# Altium schematic symbol library BARKO_SCHLIB.SchLib: 1064 symbols (part 1 of 11) (continued)
## C-2U2F-0603_1 (continued)
CAP CER 2.2UF 10V X7R 0603; Manufacturer: Samsung; Manufacturer Part Number: CL10B225KP8NNNC; Material: Ceramic; Tolerance: 10%; .PCBCHK: USED; .Creator: F:TALI; Washability: OK; Stock 1: 0; Pricing 1: 1=0.19, 10=0.133, 100=0.0625, 500=0.04384, 1000=0.0363 (USD); Mount: Surface Mount; Case Code (Metric): 1608; Contact Plating: Tin; Min Operating Temperature: -55°C; Max Operating Temperature: 125°C; Package Quantity: 1; Packaging: Tape and Reel; Capacitance: 2.2uF; Dielectric: X7R; Length: 1.6mm; Height: 0.8mm; Width: 0.031inch; Thickness: 0.035inch; Depth: 0.8mm; Radiation Hardening: No; ComponentLink1URL: https://media.digikey.com/pdf/Data%20Sheets/Samsung%20PDFs/CL_Series_MLCC_ds.pdf; ComponentLink1Description: https://media.digikey.com/pdf/Data%20Sheets/Samsung%20PDFs/CL_Series_MLCC_ds.pdf; ComponentLink2URL: http://www1.futureelectronics.com/doc/SAMSUNG/CL10B225KP8NNNC.pdf; ComponentLink2Description: http://www1.futureelectronics.com/doc/SAMSUNG/CL10B225KP8NNNC.pdf; ComponentLink3URL: https://www.verical.com/server-webapp/html/getDatasheet?partID=359568; ComponentLink3Description: https://www.verical.com/server-webapp/html/getDatasheet?partID=359568; ComponentLink4URL: https://produktinfo.conrad.com/datenblaetter/450000-474999/457933-da-01-en-VS_KONDENSATOR_0603.pdf; ComponentLink4Description: https://produktinfo.conrad.com/datenblaetter/450000-474999/457933-da-01-en-VS_KONDENSATOR_0603.pdf; Case Code (Imperial): 0603; Stock 2: 0; Pricing 2: 1=0.28, 10=0.194, 100=0.0981, 500=0.06714, 1000=0.0594 (USD); Weight: 7.1E-05oz; Dielectric Material: Ceramic; Voltage Rating (DC): 10V; Termination: SMD/SMT; Composition: Ceramic; Lead Free: Lead Free; REACH SVHC: No SVHC; ComponentLink5URL: https://product.tdk.com/info/en/catalog/spec/mlccspec_commercial_general_midvoltage_en.pdf; ComponentLink5Description: https://product.tdk.com/info/en/catalog/spec/mlccspec_commercial_general_midvoltage_en.pdf; ComponentLink6URL: http://www.mouser.com/ds/2/400/lcc_commercial_general_en-837201.pdf; ComponentLink6Description: http://www.mouser.com/ds/2/400/lcc_commercial_general_en-837201.pdf; ComponentLink7URL: http://www.farnell.com/datasheets/2291921.pdf; ComponentLink7Description: http://www.farnell.com/datasheets/2291921.pdf; ComponentLink8URL: http://www.farnell.com/datasheets/1796654.pdf; ComponentLink8Description: http://www.farnell.com/datasheets/1796654.pdf; ComponentLink9URL: http://www.farnell.com/datasheets/1913358.pdf; ComponentLink9Description: http://www.farnell.com/datasheets/1913358.pdf; Stock 3: 0; Pricing 3: 1=0.33, 10=0.228, 100=0.1291, 500=0.0911, 1000=0.07971 (USD); Features: Soft Termination; .SCHCHK: USED; Supplier 1: Digi-Key; Supplier Part Number 1: 1276-1134-6-ND
footprint C-0603
pins: 1, 2

## C-2U2F-0603_2
designator C?, comment 2U2F  Case/Package: 0603  Voltage Rating: 6.3V
CAP CER 2.2UF 6.3V X7R 0603; Manufacturer: Samsung; Manufacturer Part Number: CL10B225KQ8NFNC; Tolerance: 10%; Dielectric Material: Ceramic; .PCBCHK: USED; .Creator: F:TALI; Washability: OK; Stock 1: 0; Pricing 1: 1=0.14, 10=0.099, 100=0.0467, 500=0.03272, 1000=0.02708 (USD); Mount: Surface Mount; Case Code (Metric): 1608; Case Code (Imperial): 0603; Min Operating Temperature: -55°C; Max Operating Temperature: 125°C; Package Quantity: 1; Packaging: Tape and Reel; Capacitance: 2.2uF; Dielectric: X7R; Length: 0.063inch; Height: 0.8mm; Width: 0.031inch; Thickness: 0.035inch; Depth: 0.8mm; Radiation Hardening: No; ComponentLink1URL: http://www.samsungsem.com/kr/front/downloadcms.do?path=/kr/support/product-search/mlcc/__icsFiles/afieldfile/2014/11/05&fileName=C_CL10B225KQ8NFNC.pdf; ComponentLink1Description: http://www.samsungsem.com/kr/front/downloadcms.do?path=/kr/support/product-search/mlcc/__icsFiles/afieldfile/2014/11/05&fileName=C_CL10B225KQ8NFNC.pdf; Stock 2: 1; Pricing 2: 1=0.29, 10=0.198, 100=0.1124, 500=0.07936, 1000=0.06943 (USD); Weight: 7.1E-05oz; Voltage Rating (DC): 6.3V; Termination: SMD/SMT; Composition: Ceramic; Lead Free: Lead Free; REACH SVHC: No SVHC; ComponentLink2URL: http://www.mouser.com/ds/2/400/lcc_commercial_general_en-837201.pdf; ComponentLink2Description: http://www.mouser.com/ds/2/400/lcc_commercial_general_en-837201.pdf; ComponentLink3URL: https://product.tdk.com/info/en/catalog/spec/mlccspec_commercial_general_midvoltage_en.pdf; ComponentLink3Description: https://product.tdk.com/info/en/catalog/spec/mlccspec_commercial_general_midvoltage_en.pdf; ComponentLink4URL: http://www.farnell.com/datasheets/1796654.pdf; ComponentLink4Description: http://www.farnell.com/datasheets/1796654.pdf; ComponentLink5URL: https://product.tdk.com/en/products/common/pdf/mlcc_partnumber_description.pdf; ComponentLink5Description: https://product.tdk.com/en/products/common/pdf/mlcc_partnumber_description.pdf; Stock 3: 48; Pricing 3: 1=0.29, 10=0.197, 100=0.1, 500=0.06842, 1000=0.06052 (USD); .SCHCHK: USED; Supplier 1: Digi-Key; Supplier Part Number 1: 1276-2017-6-ND
footprint C-0603
pins: 1, 2

## C-2U2F-1206
designator C?, comment 2U2F  Voltage Rating: 35V  Case/Package: 1206
CAP TANT 2.2UF 35V 20% 1206; Manufacturer: KEMET; Manufacturer Part Number: T491A225M035AT; ESR (Equivalent Series Resistance): 4.5R; Life (Hours): 2000Hour; Polarity: Polar; Dissipation Factor: 6%; Dielectric Material: Tantalum; Leakage Current: 500nA; .PCBCHK: USED; .Creator: F:TALI; Washability: OK; Stock 1: 229187; Pricing 1: 1=0.65, 10=0.463, 100=0.3048, 500=0.22582, 1000=0.19194 (USD); Mount: Surface Mount; Case Code (Metric): 3216; Case Code (Imperial): 1206; Min Operating Temperature: -55°C; Max Operating Temperature: 125°C; Package Quantity: 2000; Packaging: Tape and Reel; Capacitance: 2.2uF; Tolerance: 20%; Voltage Rating (DC): 35V; Features: General Purpose; Length: 0.126inch; Height: 1.6mm; Width: 0.063inch; Height - Seated (Max): 0.071inch; Depth: 1.6mm; Radiation Hardening: No; Lead Free: Lead Free; ComponentLink1URL: http://www.kemet.com/Lists/ProductCatalog/Attachments/254/KEM_T2005_T491.pdf; ComponentLink1Description: http://www.kemet.com/Lists/ProductCatalog/Attachments/254/KEM_T2005_T491.pdf; Stock 2: 743; Pricing 2: 1=0.65, 10=0.463, 100=0.3048, 500=0.22582, 1000=0.19194 (USD); REACH SVHC: No SVHC; Stock 3: 30366; Pricing 3: 1=0.93, 10=0.706, 100=0.5053, 500=0.39124, 1000=0.33689 (USD); Number of Pins: 2; Weight: 0.000571oz; Termination: SMD/SMT; ComponentLink2URL: http://datasheets.avx.com/TAJ.pdf; ComponentLink2Description: http://datasheets.avx.com/TAJ.pdf; ComponentLink3URL: https://www.verical.com/server-webapp/html/getDatasheet?partID=62912; ComponentLink3Description: https://www.verical.com/server-webapp/html/getDatasheet?partID=62912; ComponentLink4URL: http://www.avx.com/docs/Catalogs/taj.pdf; ComponentLink4Description: http://www.avx.com/docs/Catalogs/taj.pdf; ComponentLink5URL: http://www.farnell.com/datasheets/1680476.pdf; ComponentLink5Description: http://www.farnell.com/datasheets/1680476.pdf; .SCHCHK: USED; Supplier 1: Digi-Key; Supplier Part Number 1: 399-10446-6-ND
footprint C-1206
pins: 1, 2
text: +

## C-2U2F-1210
designator C?, comment 2U2F  Voltage: 100V  Case/Package: 1210
CAP CER 2.2UF 100V X7R 1210; Manufacturer: Samsung; Manufacturer Part Number: CL32B225KCJSNNE; Tolerance: 10%; .PCBCHK: USED; .Creator: F:TALI; Washability: OK; Stock 1: 0; Pricing 1: 1=0.58, 10=0.41, 100=0.27, 500=0.2 (USD); Mount: Surface Mount; Case Code (Metric): 3225; Case Code (Imperial): 1210; Contact Plating: Tin; Min Operating Temperature: -55°C; Max Operating Temperature: 125°C; Capacitance: 2.2uF; Voltage Rating: 100V; Packaging: Tape and Reel; Package Quantity: 1; Dielectric: X7R; Length: 3.2mm; Height: 2.5mm; Width: 0.098inch; Thickness: 0.106inch; Depth: 2.5mm; Radiation Hardening: No; ComponentLink1URL: http://www1.futureelectronics.com/doc/SAMSUNG/CL32B225KCJSNNE.pdf; ComponentLink1Description: http://www1.futureelectronics.com/doc/SAMSUNG/CL32B225KCJSNNE.pdf; ComponentLink2URL: http://www.samsungsem.com/kr/support/product-search/mlcc/CL32B225KCJSNNE .jsp; ComponentLink2Description: http://www.samsungsem.com/kr/support/product-search/mlcc/CL32B225KCJSNNE .jsp; ComponentLink3URL: https://www.verical.com/server-webapp/html/getDatasheet?partID=357497; ComponentLink3Description: https://www.verical.com/server-webapp/html/getDatasheet?partID=357497; Stock 2: 0; Pricing 2: 1=0.92, 10=0.648, 100=0.4269, 500=0.31626 (USD); Number of Pins: 2; Weight: 0.000564oz; Voltage Rating (DC): 100V; Termination: SMD/SMT; Composition: Ceramic; REACH SVHC: No SVHC; Lead Free: Lead Free; ComponentLink4URL: http://www.mouser.com/ds/2/400/lcc_commercial_general_en-837201.pdf; ComponentLink4Description: http://www.mouser.com/ds/2/400/lcc_commercial_general_en-837201.pdf; ComponentLink5URL: http://www.farnell.com/datasheets/1698875.pdf; ComponentLink5Description: http://www.farnell.com/datasheets/1698875.pdf; ComponentLink6URL: http://www.farnell.com/datasheets/1484596.pdf; ComponentLink6Description: http://www.farnell.com/datasheets/1484596.pdf; ComponentLink7URL: https://www.verical.com/server-webapp/html/getDatasheet?partID=725361; ComponentLink7Description: https://www.verical.com/server-webapp/html/getDatasheet?partID=725361; ComponentLink8URL: http://product.tdk.com/en/catalog/datasheets/mlcc_commercial_midvoltage_en.pdf; ComponentLink8Description: http://product.tdk.com/en/catalog/datasheets/mlcc_commercial_midvoltage_en.pdf; Stock 3: 0; Pricing 3: 1=1.42, 10=1.121, 100=0.8409 (USD); Features: Soft Termination; Ratings: AEC-Q200; .SCHCHK: USED; Supplier 1: Digi-Key; Supplier Part Number 1: 1276-3362-6-ND
footprint C-1210
pins: 1, 2

## C-2u2F-2220
designator C?, comment 2u2F  Case/Package: 2220  Voltage Rating: 250V
CAP CER 2.2UF 250V X7T 2220; Manufacturer: TDK; Manufacturer Part Number: C5750X7T2E225M250KA; Tolerance: 20%; Ripple Current: 900mA; Polarity: Polar; Impedance: 120mR; Voltage: 50V; Life (Hours): 2000Hour; Supplier 1: Digi-Key; Supplier Part Number 1: 445-13418-1-ND; Stock: 3362; Pricing: 1=3.37, 10=2.723, 50=2.376, 100=2.079 (USD); RoHS: Yes; Mount: Surface Mount; Weight: 0.016932oz; Case Code (Imperial): 2220; Case Code (Metric): 5750; Min Operating Temperature: -55°C; Max Operating Temperature: 125°C; Dielectric: X7T; Termination: SMD/SMT; Voltage Rating (DC): 250V; Package Quantity: 1; Packaging: Tape and Reel; Capacitance: 2.2uF; Length: 0.224inch; Height: 2.5mm; Thickness: 0.11inch; Width: 5mm; Lead Free: Lead Free; ComponentLink1URL: http://www.mouser.com/ds/2/400/lcc_commercial_general_en-837201.pdf?src-supplier=Mouser; ComponentLink1Description: http://www.mouser.com/ds/2/400/lcc_commercial_general_en-837201.pdf?src-supplier=Mouser; ComponentLink2URL: https://product.tdk.com/info/en/catalog/spec/mlccspec_commercial_general_midvoltage_en.pdf?src-supplier=Digi-Key; ComponentLink2Description: https://product.tdk.com/info/en/catalog/spec/mlccspec_commercial_general_midvoltage_en.pdf?src-supplier=Digi-Key; ComponentLink3URL: https://product.tdk.com/info/en/documents/chara_sheet/C5750X7T2E225M250KA.pdf?src-supplier=Digi-Key; ComponentLink3Description: https://product.tdk.com/info/en/documents/chara_sheet/C5750X7T2E225M250KA.pdf?src-supplier=Digi-Key; ComponentLink4URL: http://product.tdk.com/en/catalog/datasheets/mlcc_commercial_midvoltage_en.pdf?src-supplier=Avnet; ComponentLink4Description: http://product.tdk.com/en/catalog/datasheets/mlcc_commercial_midvoltage_en.pdf?src-supplier=Avnet; Diameter: 10mm; Height - Seated (Max): 0.413inch; Lead Pitch: 4.5mm; ComponentLink5URL: http://www.mouser.com/ds/2/293/e-ucm-883824.pdf?src-supplier=Mouser; ComponentLink5Description: http://www.mouser.com/ds/2/293/e-ucm-883824.pdf?src-supplier=Mouser; ComponentLink6URL: http://uk.rs-online.com/webdocs/13bc/0900766b813bca52.pdf?src-supplier=RSComponents; ComponentLink6Description: http://uk.rs-online.com/webdocs/13bc/0900766b813bca52.pdf?src-supplier=RSComponents; ComponentLink7URL: http://nichicon-us.com/english/products/pdfs/e-ch_ta.pdf?src-supplier=Digi-Key; ComponentLink7Description: http://nichicon-us.com/english/products/pdfs/e-ch_ta.pdf?src-supplier=Digi-Key; ComponentLink8URL: http://nichicon-us.com/english/products/pdfs/e-ucm.pdf?src-supplier=Digi-Key; ComponentLink8Description: http://nichicon-us.com/english/products/pdfs/e-ucm.pdf?src-supplier=Digi-Key
footprint C-2220
pins: 1, 2

## C-3N3F-0603
designator C?, comment 3N3F  Voltage Rating: 100V  Case/Package: 0603
CAP CER 3300PF 100V X7R 0603; Manufacturer: TDK; Manufacturer Part Number: CGA3E2X7R2A332K080AA; Capacitance: 3.3nF; Tolerance: 10%; .PCBCHK: USED; .Creator: F:TALI; Washability: OK; Stock 1: 22990; Pricing 1: 1=0.1, 10=0.076, 100=0.0338, 500=0.02416, 1000=0.01898 (USD); Mount: Surface Mount; Weight: 7.1E-05oz; Case Code (Metric): 1608; Case Code (Imperial): 0603; Min Operating Temperature: -55°C; Max Operating Temperature: 125°C; Package Quantity: 4000; Packaging: Tape and Reel; Voltage Rating (DC): 100V; Dielectric: X7R; Termination: SMD/SMT; Composition: Ceramic; Length: 1.6mm; Height: 0.8mm; Width: 0.031inch; Thickness: 0.035inch; Depth: 0.8mm; Ratings: AEC-Q200; REACH SVHC: No SVHC; ComponentLink1URL: http://www.mouser.com/ds/2/400/lcc_automotive_midvoltage_en-355485.pdf; ComponentLink1Description: http://www.mouser.com/ds/2/400/lcc_automotive_midvoltage_en-355485.pdf; ComponentLink2URL: http://www.farnell.com/datasheets/1807242.pdf; ComponentLink2Description: http://www.farnell.com/datasheets/1807242.pdf; Stock 2: 40000; Pricing 2: 1=0.16, 10=0.114, 100=0.0535, 500=0.03748, 1000=0.03103 (USD); Radiation Hardening: No; Lead Free: Lead Free; ComponentLink3URL: http://search.murata.co.jp/Ceramy/image/img/w_hinm/S0717E.pdf; ComponentLink3Description: http://search.murata.co.jp/Ceramy/image/img/w_hinm/S0717E.pdf; ComponentLink4URL: http://psearch.murata.com/capacitor/product/GCM188R72A332KA37%23.pdf; ComponentLink4Description: http://psearch.murata.com/capacitor/product/GCM188R72A332KA37%23.pdf; .SCHCHK: USED; Supplier 1: Digi-Key; Supplier Part Number 1: 445-5809-6-ND
footprint C-0603
pins: 1, 2

## C-3n3F-0805
designator C?, comment 3n3F  Voltage Rating: 50V  Case/Package: 0805
CAP CER 3300PF 50V X7R 0805; Manufacturer 1: Wurth Electronics; Manufacturer Part Number: 885012207089; Capacitance: 3.3nF; Tolerance: 10%; .Creator: M.OZKAN; .PCBCHK: USED; Supplier 1: Digi-Key; Supplier Part Number 1: 732-8071-1-ND; RoHS: Yes; Category: Ceramic Capacitors; Stock: 3791; Pricing: 1=0,10000, 10=0,03600, 100=0,03230, 500=0,02858 (USD); Mount: Surface Mount; Case Code (Imperial): 0805; Case Code (Metric): 2012; Min Operating Temperature: -55°C; Max Operating Temperature: 125°C; Packaging: Tape and Reel; Length: 0.079inch; Width: 0.049inch; Thickness: 0.035inch; ComponentLink1URL: https://katalog.we-online.de/pbs/datasheet/885012207089.pdf?src-supplier=Digi-Key; ComponentLink1Description: https://katalog.we-online.de/pbs/datasheet/885012207089.pdf?src-supplier=Digi-Key; .SCHCHK: USED
footprint C-0805
pins: 1, 2

## C-3P9F-0402
designator C?, comment 3P9F  Voltage Rating: 50V  Case/Package: 0402
CAP CER 3.9PF 50V C0G/NP0 0402; Manufacturer: Murata; Manufacturer Part Number: GJM1555C1H3R9WB01D; Dielectric: C0G; Washability: OK; .Creator: M.OZKAN; .PCBCHK: USED; Stock: 39877; Pricing: 1=0,30000, 10=0,20500, 100=0,11610, 500=0,08198, 1000=0,07173, 2500=0,06831, 5000=0,06319 (USD); RoHS: Yes; Mount: Surface Mount; Case Code (Imperial): 0402; Case Code (Metric): 1005; Min Operating Temperature: -55°C; Max Operating Temperature: 125°C; Voltage Rating (DC): 50V; Capacitance: 3.9pF; Packaging: Tape and Reel; Package Quantity: 10000; Termination: SMD/SMT; Length: 1mm; Height: 0.5mm; Width: 0.02inch; Thickness: 0.022inch; Depth: 0.5mm; Radiation Hardening: No; ComponentLink1URL: https://datasheet.ciiva.com/11613/product-11613637.pdf?src-supplier=Avnet; ComponentLink1Description: https://datasheet.ciiva.com/11613/product-11613637.pdf?src-supplier=Avnet; Supplier Part Number: 490-11216-1-ND; Supplier 1: Digi-Key; Supplier Part Number 1: 490-11216-1-ND; .SCHCHK: USED
footprint C-0402
pins: 1, 2

## C-3PF-0402
designator C?, comment 3PF  Voltage Rating: 50V  Case/Package: 0402
CAP CER 3PF 50V C0G/NP0 0402; Manufacturer: Murata; Manufacturer Part Number: GJM1555C1H3R0WB01D; Dielectric: C0G; Washability: OK; .Creator: M.OZKAN; .PCBCHK: USED; Supplier: Digi-Key; Stock: 90775; Pricing: 1=0,30000, 10=0,20500, 100=0,11610, 500=0,08198, 1000=0,07173, 2500=0,06831, 5000=0,06319 (USD); RoHS: Yes; Mount: Surface Mount; Case Code (Imperial): 0402; Case Code (Metric): 1005; Min Operating Temperature: -55°C; Max Operating Temperature: 125°C; Voltage Rating (DC): 50V; Capacitance: 3pF; Package Quantity: 10000; Packaging: Tape and Reel; Termination: SMD/SMT; Length: 1mm; Height: 0.5mm; Width: 0.5mm; Thickness: 0.022inch; Depth: 0.5mm; Radiation Hardening: No; ComponentLink1URL: http://www.mouser.com/ds/2/281/c02e-2905.pdf?src-supplier=Mouser; ComponentLink1Description: http://www.mouser.com/ds/2/281/c02e-2905.pdf?src-supplier=Mouser; ComponentLink2URL: http://search.murata.co.jp/Ceramy/image/img/PDF/ENG/GJM1555C1H3R0WB01.pdf?src-supplier=Avnet; ComponentLink2Description: http://search.murata.co.jp/Ceramy/image/img/PDF/ENG/GJM1555C1H3R0WB01.pdf?src-supplier=Avnet; ComponentLink3URL: http://components.arrow.com/part/dataview/46522145S277297N2606?src-supplier=Arrow; ComponentLink3Description: http://components.arrow.com/part/dataview/46522145S277297N2606?src-supplier=Arrow; ComponentLink4URL: http://search.murata.co.jp/Ceramy/image/img/A01X/G101/ENG/GJM1555C1H3R0WB01-01.pdf?src-supplier=Digi-Key; ComponentLink4Description: http://search.murata.co.jp/Ceramy/image/img/A01X/G101/ENG/GJM1555C1H3R0WB01-01.pdf?src-supplier=Digi-Key; ComponentLink5URL: http://search.murata.co.jp/Ceramy/image/img/A01X/partnumbering_e_01.pdf?src-supplier=Digi-Key; ComponentLink5Description: http://search.murata.co.jp/Ceramy/image/img/A01X/partnumbering_e_01.pdf?src-supplier=Digi-Key; Supplier Part Number: 490-11211-1-ND; Supplier 1: Digi-Key; Supplier Part Number 1: 490-11211-1-ND; .SCHCHK: USED
footprint C-0402
pins: 1, 2

## C-4N7-0402
designator C?, comment 4N7  Voltage Rating: 16V  Case/Package: 0402
CAP CER 4700PF 16V X7R 0402; Manufacturer: Yageo; Manufacturer Part Number: CC0402KRX7R7BB472; Dielectric Material: Ceramic; Capacitance: 4.7nF; Tolerance: 10%; Insulation Resistance: 100GR; Number of Lines: 2; Shielding: Unshielded; Current Rating: 200mA; Inductance: 100uH; DC Resistance (DCR): 2R; Test Frequency: 1MHz; .Creator: F:TALI; .PCBCHK: USED; Washability: OK; Supplier 1: Digi-Key; Stock 1: 20127; Pricing 1: 1 = 0.10000, 10 = 0.02900, 100 = 0.01280, 500 = 0.00912, 1000 = 0.00716, 2500 = 0.00651, 5000 = 0.00599 (USD); Mount: Surface Mount; Case Code (Metric): 1005; Min Operating Temperature: -55°C; Max Operating Temperature: 125°C; Voltage Rating (DC): 16V; Packaging: Tape and Reel; Package Quantity: 10000; Dielectric: X7R; Termination: SMD/SMT; Composition: Ceramic; Length: 1mm; Height: 0.5mm; Width: 0.5mm; Thickness: 0.022inch; Depth: 0.5mm; Radiation Hardening: No; REACH SVHC: No SVHC; Lead Free: Lead Free; Halogen Free: Halogen Free; ComponentLink1URL: http://www.farnell.com/datasheets/1489800.pdf?src-supplier=Element14; ComponentLink1Description: http://www.farnell.com/datasheets/1489800.pdf?src-supplier=Element14; ComponentLink2URL: http://datasheet.octopart.com/CC0402KRX7R7BB472-Yageo-datasheet-10883670.pdf; ComponentLink2Description: http://datasheet.octopart.com/CC0402KRX7R7BB472-Yageo-datasheet-10883670.pdf; ComponentLink3URL: http://datasheet.octopart.com/CC0402KRX7R7BB472-Yageo-datasheet-62336348.pdf?src-supplier=Element14; ComponentLink3Description: http://datasheet.octopart.com/CC0402KRX7R7BB472-Yageo-datasheet-62336348.pdf?src-supplier=Element14; ComponentLink4URL: http://datasheet.octopart.com/CC0402KRX7R7BB472-Yageo-datasheet-5301394.pdf?src-supplier=Newark; ComponentLink4Description: http://datasheet.octopart.com/CC0402KRX7R7BB472-Yageo-datasheet-5301394.pdf?src-supplier=Newark; ComponentLink5URL: http://datasheet.octopart.com/CC0402KRX7R7BB472-Yageo-datasheet-24578986.pdf?src-supplier=Future+Electronics; ComponentLink5Description: http://datasheet.octopart.com/CC0402KRX7R7BB472-Yageo-datasheet-24578986.pdf?src-supplier=Future+Electronics; ComponentLink6URL: http://datasheet.octopart.com/CC0402KRX7R7BB472-Yageo-datasheet-27626582.pdf?src-supplier=Future+Electronics; ComponentLink6Description: http://datasheet.octopart.com/CC0402KRX7R7BB472-Yageo-datasheet-27626582.pdf?src-supplier=Future+Electronics; ComponentLink7URL: http://datasheet.octopart.com/CC0402KRX7R7BB472-Yageo-datasheet-8324442.pdf?src-supplier=Future+Electronics; ComponentLink7Description: http://datasheet.octopart.com/CC0402KRX7R7BB472-Yageo-datasheet-8324442.pdf?src-supplier=Future+Electronics; ComponentLink8URL: http://datasheet.octopart.com/CC0402KRX7R7BB472-Yageo-datasheet-10911834.pdf?src-supplier=Future+Electronics; ComponentLink8Description: http://datasheet.octopart.com/CC0402KRX7R7BB472-Yageo-datasheet-10911834.pdf?src-supplier=Future+Electronics; ComponentLink9URL: http://datasheet.octopart.com/CC0402KRX7R7BB472-Yageo-datasheet-12526321.pdf?src-supplier=Future+Electronics; ComponentLink9Description: http://datasheet.octopart.com/CC0402KRX7R7BB472-Yageo-datasheet-12526321.pdf?src-supplier=Future+Electronics; ComponentLink10URL: http://datasheet.octopart.com/CC0402KRX7R7BB472-Yageo-datasheet-15895757.pdf?src-supplier=Future+Electronics; ComponentLink10Description: http://datasheet.octopart.com/CC0402KRX7R7BB472-Yageo-datasheet-15895757.pdf?src-supplier=Future+Electronics; Supplier Part Number 1: 311-1709-1-ND; Case Code (Imperial): 0402; RoHS: Yes; Weight: 0.005997oz; Current: 200mA; Max DC Current: 200mA; DC Current: 200mA; Military Standard: Not; ComponentLink11URL: https://www.verical.com/server-webapp/html/getDatasheet?partID=442532&src-supplier=Verical; ComponentLink11Description: https://www.verical.com/server-webapp/html/getDatasheet?partID=442532&src-supplier=Verical; ComponentLink12URL: http://search.murata.co.jp/Ceramy/image/img/PDF/ENG/L0132S0197DLW43S.pdf?src-supplier=Avnet; ComponentLink12Description: http://search.murata.co.jp/Ceramy/image/img/PDF/ENG/L0132S0197DLW43S.pdf?src-supplier=Avnet; ComponentLink13URL: http://www.murata.com/en-eu/products/productdata/8796758605854/QFLC9101.pdf?src-supplier=Digi-Key; ComponentLink13Description: http://www.murata.com/en-eu/products/productdata/8796758605854/QFLC9101.pdf?src-supplier=Digi-Key; ComponentLink14URL: http://search.murata.co.jp/Ceramy/image/img/PDF/ENG/L0132S0197DLW43S.pdf?src-supplier=Avnet+Europe; ComponentLink14Description: http://search.murata.co.jp/Ceramy/image/img/PDF/ENG/L0132S0197DLW43S.pdf?src-supplier=Avnet+Europe; ComponentLink15URL: http://www.murata.com/products/catalog/pdf/k35e.pdf?src-supplier=Future+Electronics; ComponentLink15Description: http://www.murata.com/products/catalog/pdf/k35e.pdf?src-supplier=Future+Electronics; ComponentLink16URL: https://media.digikey.com/pdf/Data%20Sheets/Murata%20PDFs/DLx_Series.pdf?src-supplier=Digi-Key; ComponentLink16Description: https://media.digikey.com/pdf/Data%20Sheets/Murata%20PDFs/DLx_Series.pdf?src-supplier=Digi-Key; .SCHCHK: USED
footprint C-0402
pins: 1, 2

## C-4N7F-0603
designator C?, comment 4N7F  Voltage Rating: 50V  Case/Package: 0603
CAP CER 4700PF 50V X7R 0603; Manufacturer: Samsung; Manufacturer Part Number: CL10B472KB8NNNC; Material: Ceramic; Capacitance: 4.7nF; Tolerance: 5%; Dielectric: C0G; Dissipation Factor: 2.5%; .PCBCHK: USED; .Creator: F:TALI; Washability: OK; Stock 1: 40000; Pricing 1: 1=0.1, 10=0.036, 100=0.0162, 500=0.01156, 1000=0.00908 (USD); Mount: Surface Mount; Case Code (Metric): 1608; Contact Plating: Tin; Min Operating Temperature: -55°C; Max Operating Temperature: 125°C; Voltage: 50V; Voltage Rating (DC): 50V; Packaging: Tape and Reel; Length: 1.6mm; Height: 0.8mm; Depth: 0.8mm; Width: 0.031inch; Thickness: 0.035inch; Radiation Hardening: No; Lead Free: Lead Free; ComponentLink1URL: https://www.verical.com/server-webapp/html/getDatasheet?partID=359559; ComponentLink1Description: https://www.verical.com/server-webapp/html/getDatasheet?partID=359559; ComponentLink2URL: https://media.digikey.com/pdf/Data%20Sheets/Samsung%20PDFs/CL_Series_MLCC_ds.pdf; ComponentLink2Description: https://media.digikey.com/pdf/Data%20Sheets/Samsung%20PDFs/CL_Series_MLCC_ds.pdf; ComponentLink3URL: http://www1.futureelectronics.com/doc/SAMSUNG%20PASSIVE/CL05B104KQ5NNNC.pdf; ComponentLink3Description: http://www1.futureelectronics.com/doc/SAMSUNG%20PASSIVE/CL05B104KQ5NNNC.pdf; ComponentLink4URL: https://www.distrelec.biz/Web/Downloads/_e/ng/MLCC_CatalogDownload2013_ENG.pdf?mime=application%2Fpdf; ComponentLink4Description: https://www.distrelec.biz/Web/Downloads/_e/ng/MLCC_CatalogDownload2013_ENG.pdf?mime=application%2Fpdf; ComponentLink5URL: https://produktinfo.conrad.com/datenblaetter/450000-474999/457744-da-01-en-VS_KONDENSATOR_0603.pdf; ComponentLink5Description: https://produktinfo.conrad.com/datenblaetter/450000-474999/457744-da-01-en-VS_KONDENSATOR_0603.pdf; Case Code (Imperial): 0603; Stock 2: 40000; Pricing 2: 1=0.1, 10=0.049, 100=0.0219, 500=0.01562, 1000=0.01227 (USD); Dielectric Material: Ceramic; Package Quantity: 4000; Termination: SMD/SMT; ComponentLink6URL: http://www.mouser.com/ds/2/212/KEM_C1002_X7R_SMD-1102033.pdf; ComponentLink6Description: http://www.mouser.com/ds/2/212/KEM_C1002_X7R_SMD-1102033.pdf; Stock 3: 19986; Pricing 3: 1=0.1, 10=0.042, 100=0.0186, 500=0.01328, 1000=0.01043 (USD); Features: Soft Termination; ComponentLink7URL: http://www.samsungsem.com/kr/support/product-search/mlcc/CL10B472KB8SFNC.jsp; ComponentLink7Description: http://www.samsungsem.com/kr/support/product-search/mlcc/CL10B472KB8SFNC.jsp; .SCHCHK: USED; Supplier 1: Digi-Key; Supplier Part Number 1: 1276-1098-6-ND
footprint C-0603
pins: 1, 2

## C-4U7-1206 TANT
designator C?, comment 4U7  Voltage Rating: 16V  Case/Package: 1206
CAP TANT 4.7UF 16V 10% 1206; Manufacturer: KEMET; Manufacturer Part Number: T491A475K016AT; Dielectric Material: Tantalum; ESR (Equivalent Series Resistance): 4R; Polarity: Polar; Dissipation Factor: 6%; Leakage Current: 800nA; Ripple Current: 137mA; Life (Hours): 2000Hour; Washability: OK; .Creator: M.OZKAN; .PCBCHK: USED; Supplier 1: Digi-Key; Stock 1: 302152; Pricing 1: 1=0.41000, 10=0.29000, 100=0.19100, 500=0.14146, 1000=0.12024 (USD); RoHS: Yes; Mount: Surface Mount; Number of Pins: 2; Case Code (Metric): 3216; Case Code (Imperial): 1206; Min Operating Temperature: -55°C; Max Operating Temperature: 125°C; Capacitance: 4.7uF; Tolerance: 10%; Packaging: Tape and Reel; Voltage Rating (DC): 16V; Termination: SMD/SMT; Voltage: 16V; Package Quantity: 1; Features: General Purpose; Length: 3.2mm; Height: 1.6mm; Depth: 1.6mm; Width: 1.6mm; Height - Seated (Max): 0.071inch; Radiation Hardening: No; Lead Free: Lead Free; REACH SVHC: No SVHC; ComponentLink1URL: https://datasheet.ciiva.com/34302/1573425-34302513.pdf?src-supplier=Jameco; ComponentLink1Description: https://datasheet.ciiva.com/34302/1573425-34302513.pdf?src-supplier=Jameco; ComponentLink2URL: https://datasheet.ciiva.com/20171/458253-da-en-01-20171911.pdf?src-supplier=Rapid+Electronics; ComponentLink2Description: https://datasheet.ciiva.com/20171/458253-da-en-01-20171911.pdf?src-supplier=Rapid+Electronics; ComponentLink3URL: https://datasheet.ciiva.com/11793/0900766b80718482-11793043.pdf?src-supplier=RSComponents; ComponentLink3Description: https://datasheet.ciiva.com/11793/0900766b80718482-11793043.pdf?src-supplier=RSComponents; ComponentLink4URL: https://datasheet.ciiva.com/257/kem-t2005-t491-257537.pdf?src-supplier=Digi-Key; ComponentLink4Description: https://datasheet.ciiva.com/257/kem-t2005-t491-257537.pdf?src-supplier=Digi-Key; ComponentLink5URL: https://datasheet.ciiva.com/7696/1854511-7696309.pdf?src-supplier=Element14; ComponentLink5Description: https://datasheet.ciiva.com/7696/1854511-7696309.pdf?src-supplier=Element14; ComponentLink6URL: https://datasheet.ciiva.com/7696/1854511-7696312.pdf?src-supplier=Element14; ComponentLink6Description: https://datasheet.ciiva.com/7696/1854511-7696312.pdf?src-supplier=Element14; ComponentLink7URL: https://datasheet.ciiva.com/257/kem-t2005-t491-257536.pdf?src-supplier=Digi-Key; ComponentLink7Description: https://datasheet.ciiva.com/257/kem-t2005-t491-257536.pdf?src-supplier=Digi-Key; ComponentLink8URL: https://datasheet.ciiva.com/257/kem-t2005-t491-257538.pdf?src-supplier=Digi-Key; ComponentLink8Description: https://datasheet.ciiva.com/257/kem-t2005-t491-257538.pdf?src-supplier=Digi-Key; ComponentLink9URL: https://datasheet.ciiva.com/14605/70095774-14605189.pdf?src-supplier=Allied+Electronics; ComponentLink9Description: https://datasheet.ciiva.com/14605/70095774-14605189.pdf?src-supplier=Allied+Electronics; ComponentLink10URL: https://datasheet.ciiva.com/7696/1854511-7696310.pdf?src-supplier=Element14; ComponentLink10Description: https://datasheet.ciiva.com/7696/1854511-7696310.pdf?src-supplier=Element14; ComponentLink11URL: https://datasheet.ciiva.com/7696/1854511-7696311.pdf?src-supplier=Element14; ComponentLink11Description: https://datasheet.ciiva.com/7696/1854511-7696311.pdf?src-supplier=Element14; ComponentLink12URL: https://datasheet.ciiva.com/12883/kem-t2005-t491-12883130.pdf?src-supplier=Mouser; ComponentLink12Description: https://datasheet.ciiva.com/12883/kem-t2005-t491-12883130.pdf?src-supplier=Mouser; ComponentLink13URL: https://datasheet.ciiva.com/14603/70095774-14603739.pdf?src-supplier=Allied+Electronics; ComponentLink13Description: https://datasheet.ciiva.com/14603/70095774-14603739.pdf?src-supplier=Allied+Electronics; ComponentLink14URL: https://datasheet.ciiva.com/5934/kem-t2005-t491-5934799.pdf?src-supplier=Farnell; ComponentLink14Description: https://datasheet.ciiva.com/5934/kem-t2005-t491-5934799.pdf?src-supplier=Farnell; ComponentLink15URL: https://datasheet.ciiva.com/29244/458253-da-01-en-tantal-kondensator-t491a475k016at-29244572.pdf?src-supplier=Conrad; ComponentLink15Description: https://datasheet.ciiva.com/29244/458253-da-01-en-tantal-kondensator-t491a475k016at-29244572.pdf?src-supplier=Conrad; Supplier Part Number 1: 399-3697-1-ND; .SCHCHK: USED
footprint C-TANTA-3216
pins: 1, 2
text: +

## C-4U7-1210-100V
designator C?, comment 4U7  Case/Package: 1210  Voltage Rating: 100V
CAP CER 4.7UF 100V X7S 1210; Manufacturer: Taiyo Yuden; Manufacturer Part Number: HMK325C7475KM-PE; Tolerance: 10%; Washability: OK; .Creator: M.OZKAN; .PCBCHK: USED; Supplier 1: Digi-Key; Supplier Part Number 1: 587-HMK325C7475KM-PECT-ND; Stock 1: 0; Pricing 1: 1=1.10000, 10=0.83900, 100=0.60030, 500=0.46474 (USD); RoHS: No; Mount: Surface Mount; Min Operating Temperature: -55°C; Max Operating Temperature: 125°C; Packaging: Tape and Reel; Capacitance: 4.7uF; ComponentLink1URL: http://ds.yuden.co.jp/TYCOMPAS/ut/detail.do?productNo=HMK325C7475KM-PE&amp;fileName=HMK325C7475KM-PE_SS&amp;mode=specSheetDownload&src-supplier=Digi-Key; ComponentLink1Description: http://ds.yuden.co.jp/TYCOMPAS/ut/detail.do?productNo=HMK325C7475KM-PE&amp;fileName=HMK325C7475KM-PE_SS&amp;mode=specSheetDownload&src-supplier=Digi-Key; .SCHCHK: USED
footprint C-1210
pins: 1, 2

## C-4U7F-0603
designator C?, comment 4U7  Case/Package: 0603
CAP CER 4.7UF 16V X6S 0603; Manufacturer: Taiyo Yuden; Manufacturer Part Number: EMK107BC6475KA-T; Material: Ceramic; Tolerance: 10%; .PCBCHK: USED; .Creator: F:TALI; Washability: OK; Stock 1: 1; Pricing 1: 1=0.47, 10=0.327, 100=0.1962, 500=0.14718, 1000=0.12428 (USD); Lead Free: Lead Free; Stock 2: 0; Pricing 2: 1=0.46, 10=0.323, 100=0.1937, 500=0.14524, 1000=0.12265 (USD); Mount: Surface Mount; Weight: 0.000222oz; Case Code (Metric): 1608; Case Code (Imperial): 0603; Min Operating Temperature: -55°C; Max Operating Temperature: 105°C; Dielectric: X6S; Capacitance: 4.7uF; Packaging: Tape and Reel; Voltage Rating: 16V; Termination: SMD/SMT; Composition: Ceramic; Voltage Rating (DC): 16V; Package Quantity: 4000; Length: 1.6mm; Height: 0.8mm; Width: 0.8mm; Thickness: 0.037inch; Stock 3: 0; Pricing 3: 1=0.49, 10=0.338, 100=0.2027, 500=0.15202, 1000=0.12837 (USD); Dielectric Material: Ceramic; Depth: 0.8mm; REACH SVHC: No SVHC; ComponentLink1URL: http://www.mouser.com/ds/2/400/lcc_commercial_general_en-837201.pdf; ComponentLink1Description: http://www.mouser.com/ds/2/400/lcc_commercial_general_en-837201.pdf; ComponentLink2URL: https://product.tdk.com/info/en/catalog/spec/mlccspec_commercial_general_midvoltage_en.pdf; ComponentLink2Description: https://product.tdk.com/info/en/catalog/spec/mlccspec_commercial_general_midvoltage_en.pdf; .SCHCHK: USED; Supplier 1: Digi-Key; Supplier Part Number 1: 587-4870-6-ND
footprint C-0603
pins: 1, 2

## C-6N8F-0603
designator C?, comment 6N8F  Voltage Rating: 50V  Case/Package: 0603
CAP CER 6800PF 50V X7R 0603; Manufacturer: Yageo; Manufacturer Part Number: CC0603JRX7R9BB682; Tolerance: 5%; Capacitance: 6.8nF; Washability: OK; .Creator: M.OZKAN; .PCBCHK: USED; Supplier 1: Digi-Key; Supplier Part Number 1: 311-4022-1-ND; Stock 1: 7098; Pricing 1: 1=0.12000, 10=0.08500, 100=0.03980, 500=0.02792, 1000=0.02311 (USD); RoHS: Yes; Mount: Surface Mount; Weight: 7.1E-05oz; Case Code (Imperial): 0603; Case Code (Metric): 1608; Min Operating Temperature: -55°C; Max Operating Temperature: 125°C; Dielectric: X7R; Packaging: Tape and Reel; Voltage Rating (DC): 50V; Termination: SMD/SMT; Composition: Ceramic; Length: 1.6mm; Height: 0.8mm; Width: 0.031inch; Depth: 0.8mm; Thickness: 0.035inch; Radiation Hardening: No; Lead Free: Lead Free; Halogen Free: Halogen Free; ComponentLink1URL: https://datasheet.ciiva.com/17436/upy-gphc-x7r-6-3v-to-50v-8-17436907.pdf?src-supplier=Avnet+Europe; ComponentLink1Description: https://datasheet.ciiva.com/17436/upy-gphc-x7r-6-3v-to-50v-8-17436907.pdf?src-supplier=Avnet+Europe; .SCHCHK: USED
footprint C-0603
pins: 1, 2

## C-6PF-0603
designator C?, comment 6pF  Voltage Rating: 50V  Case/Package: 0603
CAP CER 6PF 50V C0G/NP0 0603; Manufacturer: Samsung; Manufacturer Part Number: CL10C060CB8NNNC; Dielectric: C0G; Supplier 1: Digi-Key; Supplier Part Number 1: 1276-2133-1-ND; Stock: 244091; Pricing: 1=0.1, 10=0.035, 50=0.019, 100=0.0156, 500=0.0111, 1000=0.0087 (USD); RoHS: Yes; Mount: Surface Mount; Case Code (Metric): 1608; Case Code (Imperial): 0603; Min Operating Temperature: -55°C; Max Operating Temperature: 125°C; Capacitance: 6pF; Packaging: Tape and Reel; Length: 1.6mm; Width: 0.031inch; Height: 0.8mm; Thickness: 0.035inch; Depth: 0.8mm; Radiation Hardening: No; ComponentLink1URL: https://datasheet.ciiva.com/25712/cl10c060cb8nnnc-25712480.pdf?src-supplier=Digi-Key; ComponentLink1Description: https://datasheet.ciiva.com/25712/cl10c060cb8nnnc-25712480.pdf?src-supplier=Digi-Key; ComponentLink2URL: https://datasheet.ciiva.com/16199/cl05b104kq5nnnc-16199231.pdf?src-supplier=Future+Electronics; ComponentLink2Description: https://datasheet.ciiva.com/16199/cl05b104kq5nnnc-16199231.pdf?src-supplier=Future+Electronics
footprint C-0603
pins: 1, 2

## C-9PF-0603
designator C?, comment 9PF  Voltage Rating: 50V  Case/Package: 0603
CAP CER 9PF 50V C0G/NP0 0603; Manufacturer: Samsung; Manufacturer Part Number: CL10C090DB8NNNC; Dielectric: C0G; Supplier 1: Digi-Key; Supplier Part Number 1: 1276-2143-1-ND; Stock: 40826; Pricing: 1=0.1, 10=0.047, 50=0.0254, 100=0.0208, 500=0.0148, 1000=0.0117 (USD); RoHS: Yes; Mount: Surface Mount; Case Code (Metric): 1608; Case Code (Imperial): 0603; Min Operating Temperature: -55°C; Max Operating Temperature: 125°C; Capacitance: 9pF; Packaging: Tape and Reel; Length: 1.6mm; Width: 0.031inch; Height: 0.8mm; Thickness: 0.035inch; Depth: 0.8mm; Radiation Hardening: No; ComponentLink1URL: https://datasheet.ciiva.com/25712/cl10c090db8nnnc-25712516.pdf?src-supplier=Digi-Key; ComponentLink1Description: https://datasheet.ciiva.com/25712/cl10c090db8nnnc-25712516.pdf?src-supplier=Digi-Key; ComponentLink2URL: https://datasheet.ciiva.com/16507/cl10c090db8nnnc-16507528.pdf?src-supplier=Future+Electronics; ComponentLink2Description: https://datasheet.ciiva.com/16507/cl10c090db8nnnc-16507528.pdf?src-supplier=Future+Electronics
footprint C-0603
pins: 1, 2

## C-10NF-0402
designator C?, comment 10NF  Voltage Rating (DC): 50V  Case/Package: 0402
CAP CER 10000PF 50V X7R 0402; Manufacturer: Murata; Manufacturer Part Number: GRM155R71H103KA88D; Material: Ceramic; Tolerance: 10%; Voltage: 25V; Washability: OK; .Creator: M.OZKAN; .PCBCHK: USED; Supplier 1: Digi-Key; Stock 1: 9197829; Pricing 1: 1=0.10000, 10=0.03800, 100=0.01690, 500=0.01208, 1000=0.00949, 2500=0.00862, 5000=0.00794 (USD); RoHS: Yes; Mount: Surface Mount; Number of Pins: 2; Case Code (Metric): 1005; Case Code (Imperial): 0402; Min Operating Temperature: -55°C; Max Operating Temperature: 125°C; Capacitance: 10nF; Dielectric: X7R; Packaging: Tape and Reel; Package Quantity: 1; Voltage Rating: 50V; Termination: SMD/SMT; Length: 1mm; Height: 0.5mm; Width: 0.02inch; Thickness: 0.022inch; Depth: 0.5mm; Radiation Hardening: No; REACH SVHC: No SVHC; Lead Free: Lead Free; ComponentLink1URL: https://datasheet.ciiva.com/129/product-129810.pdf?src-supplier=Digi-Key; ComponentLink1Description: https://datasheet.ciiva.com/129/product-129810.pdf?src-supplier=Digi-Key; ComponentLink2URL: https://datasheet.ciiva.com/19476/1856433-19476546.pdf?src-supplier=Jameco; ComponentLink2Description: https://datasheet.ciiva.com/19476/1856433-19476546.pdf?src-supplier=Jameco; ComponentLink3URL: https://datasheet.ciiva.com/11786/0900766b80ef921d-11786340.pdf?src-supplier=RSComponents; ComponentLink3Description: https://datasheet.ciiva.com/11786/0900766b80ef921d-11786340.pdf?src-supplier=RSComponents; ComponentLink4URL: https://datasheet.ciiva.com/18100/getdatasheetpartid-27434-18100660.pdf?src-supplier=Verical; ComponentLink4Description: https://datasheet.ciiva.com/18100/getdatasheetpartid-27434-18100660.pdf?src-supplier=Verical; ComponentLink5URL: https://datasheet.ciiva.com/22698/1747449-22698420.pdf?src-supplier=Element14; ComponentLink5Description: https://datasheet.ciiva.com/22698/1747449-22698420.pdf?src-supplier=Element14; ComponentLink6URL: https://datasheet.ciiva.com/29199/454225-da-01-en-vs-kondensator-0402-29199740.pdf?src-supplier=Conrad; ComponentLink6Description: https://datasheet.ciiva.com/29199/454225-da-01-en-vs-kondensator-0402-29199740.pdf?src-supplier=Conrad; ComponentLink7URL: https://datasheet.ciiva.com/129/grm155r71h103ka88-01-129811.pdf?src-supplier=Digi-Key; ComponentLink7Description: https://datasheet.ciiva.com/129/grm155r71h103ka88-01-129811.pdf?src-supplier=Digi-Key; ComponentLink8URL: https://datasheet.ciiva.com/129/grm155r71h103ka88-01-129812.pdf?src-supplier=Digi-Key; ComponentLink8Description: https://datasheet.ciiva.com/129/grm155r71h103ka88-01-129812.pdf?src-supplier=Digi-Key; ComponentLink9URL: https://datasheet.ciiva.com/16495/product-16495290.pdf?src-supplier=Future+Electronics; ComponentLink9Description: https://datasheet.ciiva.com/16495/product-16495290.pdf?src-supplier=Future+Electronics; ComponentLink10URL: https://datasheet.ciiva.com/5410/product-5410990.pdf?src-supplier=Mouser; ComponentLink10Description: https://datasheet.ciiva.com/5410/product-5410990.pdf?src-supplier=Mouser; Supplier Part Number 1: 490-4516-1-ND; .SCHCHK: USED
footprint C-0402
pins: 1, 2

## C-10NF-0603
designator C?, comment 10NF  Voltage Rating: 100V  Case Code (Imperial): 0603
CAP CER 10000PF 100V X7R 0603; Manufacturer: TDK; Manufacturer Part Number: C1608X7R2A103M080AA; Tolerance: 20%; Dielectric Material: Ceramic; .PCBCHK: USED; .Creator: M.OZKAN; Washability: OK; Stock 1: 40000; Pricing 1: 1=0.11, 10=0.079, 100=0.0352, 500=0.02516, 1000=0.01977 (USD); Mount: Surface Mount; Case/Package: 0603; Number of Pins: 2; Weight: 7.1E-05oz; Case Code (Metric): 1608; Min Operating Temperature: -55°C; Max Operating Temperature: 125°C; Package Quantity: 1; Capacitance: 10nF; Packaging: Tape and Reel; Voltage Rating (DC): 100V; Dielectric: X7R; Termination: SMD/SMT; Composition: Ceramic; Length: 1.6mm; Height: 0.8mm; Width: 0.031inch; Depth: 0.8mm; Thickness: 0.037inch; REACH SVHC: No SVHC; ComponentLink1URL: http://www.mouser.com/ds/2/400/lcc_commercial_general_en-837201.pdf; ComponentLink1Description: http://www.mouser.com/ds/2/400/lcc_commercial_general_en-837201.pdf; ComponentLink2URL: http://www.farnell.com/datasheets/1484596.pdf; ComponentLink2Description: http://www.farnell.com/datasheets/1484596.pdf; Stock 2: 40000; Pricing 2: 1=0.1, 10=0.066, 100=0.0293, 500=0.02092, 1000=0.01643 (USD); Features: Soft Termination; Ratings: AEC-Q200; Stock 3: 89508; Pricing 3: 1=0.13, 10=0.099, 100=0.0439, 500=0.03138, 1000=0.02465, 2500=0.02241, 5000=0.02062 (USD); Radiation Hardening: No; Lead Free: Lead Free; ComponentLink3URL: https://www.verical.com/server-webapp/html/getDatasheet?partID=126825; ComponentLink3Description: https://www.verical.com/server-webapp/html/getDatasheet?partID=126825; ComponentLink4URL: http://www.avx.com/docs/Catalogs/cauto.pdf; ComponentLink4Description: http://www.avx.com/docs/Catalogs/cauto.pdf; ComponentLink5URL: http://www.mouser.com/ds/2/40/AutoMLCC-777028.pdf; ComponentLink5Description: http://www.mouser.com/ds/2/40/AutoMLCC-777028.pdf; .SCHCHK: USED; Supplier 1: Digi-Key; Supplier Part Number 1: 445-1305-6-ND
footprint C-0603
pins: 1, 2

## C-10NF-0603_1
designator C?, comment 10NF  Voltage Rating: 50V  Case Code (Imperial): 0603